# Altium schematic symbol library Electronic Devices_LIB.SchLib: 703 symbols (part 6 of 8) (continued)
## LED_DIO_RED_2mA_0603_LTST-C193KRKT-2A
designator D?, comment Case/Package: 0603  Test Current: 2mA  (hidden comment: LTST-C193KRKT-2A)
Led Red Clear 0603 Smd; Manufacturer: Vishay Lite-On; Lens Color: Colorless; Viewing Angle: 130°; Forward Voltage: 1.9V; Lens Style: Flat; Luminous Intensity: 6.5mcd; Dominant Wavelength: 629nm; Lens Size: 0.8mm; Supplier 1: Digikey; Manufacturer Part Number: LTST-C193KRKT-2A; RoHS: Yes; Category: LEDs; Stock 1: 77790; Pricing 1: 1=0.29, 10=0.16, 100=0.0978, 500=0.07338, 1000=0.06593, 2000=0.05983, 5000=0.05343, 10000=0.04959, 15000=0.04768, 25000=0.04556, 35000=0.04433, 50000=0.04314, 125000=0.0406, 250000=0.03907 (USD); Mount: Surface Mount; Color: Red; Case Code (Metric): 1608; Case Code (Imperial): 0603; Packaging: Cut Tape; Series: -; Lens Transparency: Clear; Length: 1.6mm; Width: 0.8mm; Height: 0.35mm; RoHS Compliant: Yes; ComponentLink1URL: https://datasheet.ciiva.com/6348/ltst-c193krkt-2a-6348473.pdf?src-supplier=Digikey; ComponentLink1Description: https://datasheet.ciiva.com/6348/ltst-c193krkt-2a-6348473.pdf?src-supplier=Digikey; ComponentLink2URL: https://datasheet.ciiva.com/6348/ltst-c193krkt-2a-6348475.pdf?src-supplier=Digikey; ComponentLink2Description: https://datasheet.ciiva.com/6348/ltst-c193krkt-2a-6348475.pdf?src-supplier=Digikey; ComponentLink3URL: https://datasheet.ciiva.com/6348/ltst-c193krkt-2a-6348477.pdf?src-supplier=Digikey; ComponentLink3Description: https://datasheet.ciiva.com/6348/ltst-c193krkt-2a-6348477.pdf?src-supplier=Digikey; Supplier Part Number 1: 160-1909-1-ND
footprint LED_0603-RED-0.75mm (LED 0603 RED height = 0.75mm)
pins: 1 C, 2 A

## LED_DIO_RED_20mA_0603
designator D?, comment Test Current: 20mA  Case/Package: 0603  (hidden comment: LTST-C190KRKT)
LED,  LTST-C190KRKT; Manufacturer: Vishay Lite-On; Color: Red; Lens Color: Colorless; Luminous Intensity: 54mcd; Viewing Angle: 130°; Lens Style: Diffused,Colorless,Clear,Rectangular; Power Rating: 75mW; Dominant Wavelength: 631nm; Lens Transparency: Clear; Number of Elements: 1; Wavelength: 639nm; Reverse Voltage: 5V; Forward Current: 30mA; Forward Voltage: 2.4V; Manufacturer Part Number: LTST-C190KRKT; RoHS: Yes; Category: LEDs; Stock 1: 712361; Pricing 1: 1=0.24000, 10=0.13200, 100=0.06110, 500=0.05640, 1000=0.04418, 2000=0.04324 (USD); Mount: Surface Mount; Number of Pins: 2; Case Code (Metric): 1608; Case Code (Imperial): 0603; Min Operating Temperature: -55°C; Max Operating Temperature: 85°C; Packaging: Tape and Reel; Package Quantity: 1; Illumination Color: Red; Power Dissipation: 75mW; Number of LEDs: 1; Length: 1.6mm; Width: 0.8mm; Height: 0.8mm; Depth: 0.8mm; Radiation Hardening: No; Lead Free: Lead Free; RoHS Compliant: Yes; ComponentLink1URL: https://datasheet.ciiva.com/19482/1260381-19482354.pdf?src-supplier=Jameco; ComponentLink1Description: https://datasheet.ciiva.com/19482/1260381-19482354.pdf?src-supplier=Jameco; ComponentLink2URL: https://datasheet.ciiva.com/12403/100-ltst-c190krkt-59805-12403895.pdf?src-supplier=Mouser; ComponentLink2Description: https://datasheet.ciiva.com/12403/100-ltst-c190krkt-59805-12403895.pdf?src-supplier=Mouser; ComponentLink3URL: https://datasheet.ciiva.com/16427/ltst-c190krkt-16427674.pdf?src-supplier=Future+Electronics; ComponentLink3Description: https://datasheet.ciiva.com/16427/ltst-c190krkt-16427674.pdf?src-supplier=Future+Electronics; ComponentLink4URL: https://datasheet.ciiva.com/15117/getdatasheetpartid-57395-15117240.pdf?src-supplier=Verical; ComponentLink4Description: https://datasheet.ciiva.com/15117/getdatasheetpartid-57395-15117240.pdf?src-supplier=Verical; ComponentLink5URL: https://datasheet.ciiva.com/11774/0900766b80dc02a9-11774043.pdf?src-supplier=Rs; ComponentLink5Description: https://datasheet.ciiva.com/11774/0900766b80dc02a9-11774043.pdf?src-supplier=Rs; ComponentLink6URL: https://datasheet.ciiva.com/2109/s-110-ltst-c190krkt-2109992.pdf?src-supplier=Digi-Key; ComponentLink6Description: https://datasheet.ciiva.com/2109/s-110-ltst-c190krkt-2109992.pdf?src-supplier=Digi-Key; ComponentLink7URL: https://datasheet.ciiva.com/2109/s-110-ltst-c190krkt-2109991.pdf?src-supplier=Digi-Key; ComponentLink7Description: https://datasheet.ciiva.com/2109/s-110-ltst-c190krkt-2109991.pdf?src-supplier=Digi-Key; ComponentLink8URL: https://datasheet.ciiva.com/2109/s-110-ltst-c190krkt-2109993.pdf?src-supplier=Digi-Key; ComponentLink8Description: https://datasheet.ciiva.com/2109/s-110-ltst-c190krkt-2109993.pdf?src-supplier=Digi-Key; ComponentLink9URL: https://datasheet.ciiva.com/26937/getdatasheetpartid-631582-26937958.pdf?src-supplier=Verical; ComponentLink9Description: https://datasheet.ciiva.com/26937/getdatasheetpartid-631582-26937958.pdf?src-supplier=Verical; Supplier 1: Digi-Key; Supplier 2: Mouser; Supplier 3: Arrow Electronics; Supplier Part Number 1: 160-1436-6-ND; Supplier Part Number 2: 859-LTST-C190KRKT; Supplier Part Number 3: LTST-C190KRKT
footprint LED_0603-RED-0.75mm (LED 0603 RED height = 0.75mm)
pins: 1 C, 2 A

## LED_DIO_RGB_1655
designator D?, comment 1655
NeoPixel 5050 RGB LED with Integrated Driver Chip - 10 Pack | Adafruit Industries 1655; Color: Blue,Green,Red; Number of LEDs: 10; Supplier 1: Digi-Key; Manufacturer: Adafruit Industries; Manufacturer Part Number: 1655; RoHS: Yes; Category: LEDs; Stock 1: 1874; Pricing 1: 1=4.5 (USD); Mount: Surface Mount; Length: 5mm; Width: 5mm; ComponentLink1URL: http://www.mouser.com/ds/2/737/SK6812_LED_datasheet_-953546.pdf?src-supplier=Mouser; ComponentLink1Description: http://www.mouser.com/ds/2/737/SK6812_LED_datasheet_-953546.pdf?src-supplier=Mouser; ComponentLink2URL: https://cdn-shop.adafruit.com/product-files/1138/SK6812+LED+datasheet+.pdf?src-supplier=Digi-Key; ComponentLink2Description: https://cdn-shop.adafruit.com/product-files/1138/SK6812+LED+datasheet+.pdf?src-supplier=Digi-Key; Supplier Part Number 1: 1528-1104-ND
footprint LED_RGB_WS2812B_SNAPEDA (5050)
pins: 1 C, 1 C, 1 C, 1-VDD VDD (power), 2 A, 2 A, 2 A, 2-DOUT DO, 3-GND GND (power), 4-DIN DI

## LED_DIO_RGB_3528_150141M173100
designator D?, comment 150141M173100
LED Tri-Color Blue/Green/Red 465nm/515nm/635nm 4-Pin Chip 1411(3528Metric) T/R; Manufacturer: Wurth Electronics; Color: Blue,Green,Red; Lens Color: Colorless; Viewing Angle: 120°; Lens Style: Clear,Round,Flat; Wavelength: 470nm; Forward Current: 30mA; Luminous Intensity: 230mcd; Test Current: 20mA; Forward Voltage: 3.2V; Lens Transparency: Clear; Lens Size: 2.4mm; Supplier 1: Digi-Key; Manufacturer Part Number: 150141M173100; RoHS: Yes; Category: LEDs; Stock 1: 18313; Pricing 1: 1=0.5, 50=0.489, 100=0.426, 500=0.355 (USD); Mount: Surface Mount; Case/Package: 3528; Number of Pins: 4; Case Code (Metric): 3528; Case Code (Imperial): 1411; Min Operating Temperature: -40°C; Max Operating Temperature: 85°C; Package Quantity: 1; Packaging: Cut Tape; Dominant Wavelength: 470nm; Series: WL-SFTW; Length: 3.5mm; Width: 2.8mm; Height: 2.1mm; RoHS Compliant: Yes; Reach SVHC Compliant: Unknown; ComponentLink1URL: https://datasheet.ciiva.com/29562/150141m173100-29562961.pdf?src-supplier=Digi-Key; ComponentLink1Description: https://datasheet.ciiva.com/29562/150141m173100-29562961.pdf?src-supplier=Digi-Key; ComponentLink2URL: https://datasheet.ciiva.com/29278/759471-da-01-en-smd-topled-rgb-150141m173100-29278963.pdf?src-supplier=Conrad; ComponentLink2Description: https://datasheet.ciiva.com/29278/759471-da-01-en-smd-topled-rgb-150141m173100-29278963.pdf?src-supplier=Conrad; ComponentLink3URL: https://datasheet.ciiva.com/22653/1911491-22653029.pdf?src-supplier=Element14; ComponentLink3Description: https://datasheet.ciiva.com/22653/1911491-22653029.pdf?src-supplier=Element14; Supplier Part Number 1: 732-4998-6-ND
footprint LED_RGB_3528 (SMT Full-color TOP LED Waterclear, body 3.5x2.8mm)
pins: 1 A, 2 K, 3 K, 4 K

## LED_DIO_RGB_3528_YG3528RGB3UDB06
designator D?, comment YG3528RGB3UDB06
LED Tri-Color Blue/Green/Red 465nm/515nm/635nm 4-Pin Chip 1411(3528Metric) T/R; Manufacturer: letop; Manufacturer Part Number: 150141M173100; Color: Blue,Green,Red; Lens Color: Colorless; Viewing Angle: 120°; Lens Style: Clear,Round,Flat; Wavelength: 470nm; Forward Current: 30mA; Luminous Intensity: 230mcd; Test Current: 20mA; Forward Voltage: 3.2V; Lens Transparency: Clear; Lens Size: 2.4mm; Supplier 1: Standard Chinese; RoHS: Yes; Category: LEDs; Stock 1: 18313; Pricing 1: 1=0.5, 50=0.489, 100=0.426, 500=0.355 (USD); Mount: Surface Mount; Case/Package: 3528; Number of Pins: 4; Case Code (Metric): 3528; Case Code (Imperial): 1411; Min Operating Temperature: -40°C; Max Operating Temperature: 85°C; Package Quantity: 1; Packaging: Cut Tape; Dominant Wavelength: 470nm; Series: WL-SFTW; Length: 3.5mm; Width: 2.8mm; Height: 2.1mm; RoHS Compliant: Yes; Reach SVHC Compliant: Unknown; Supplier Part Number 1: 732-4998-6-ND; ComponentLink1Description: file:///C:/Users/Elio%20Fagundez/Documents/Upwork%202023/Project%20%2316%20(%20ADN00200%20-%20HUMBERTO%20MATIAS)/Documentation/SMD-3528RGB-ROHS%20%E5%9B%9B%E8%84%9A%E5%85%B1%E9%98%B3(1)(1)%20(1).pdf; ComponentLink1URL: file:///C:/Users/Elio%20Fagundez/Documents/Upwork%202023/Project%20%2316%20(%20ADN00200%20-%20HUMBERTO%20MATIAS)/Documentation/SMD-3528RGB-ROHS%20%E5%9B%9B%E8%84%9A%E5%85%B1%E9%98%B3(1)(1)%20(1).pdf
footprint LED_RGB_3528_YG3528RGB3UDB06 (SMT Full-color TOP LED Waterclear, body 3.5x2.8mm)
pins: 1 K, 2 A, 3 K, 4 K

## LED_DIO_RGB_WS2812B-B/W
designator D?, comment WS2812B-B/W
RGB SMD5050 Light Emitting Diodes (LED) ROHS - LCSC; Manufacturer: Worldsemi; Manufacturer Part Number: 5050; Color: Blue,Green,Red; Number of LEDs: 10; Supplier 1: LCSC; RoHS: Yes; Category: LEDs; Stock 1: 1874; Mount: Surface Mount; Length: 5mm; Width: 5mm; Supplier Part Number 1: 1528-1104-ND; ComponentLink1Description: https://www.lcsc.com/product-detail/Light-Emitting-Diodes-LED_Worldsemi-WS2812B-B-W_C114586.html; ComponentLink1URL: https://www.lcsc.com/product-detail/Light-Emitting-Diodes-LED_Worldsemi-WS2812B-B-W_C114586.html; Pricing 1: 1=0.09(USD)
footprint LED_RGB_WS2812B_SNAPEDA (5050)
pins: 1 VDD (power), 1 C, 1 C, 1 C, 2 DO, 2 A, 2 A, 2 A, 3 GND (power), 4 DI

## LED_DIO_RGB_XL-3528RGBW-WS2812B
designator D?, comment WS2812B-B/W
-25℃~+80℃ Positive post RGB 120° SMD3528-4P Light Emitting Diodes (LED) ROHS; Manufacturer: XINGLIGHT; Manufacturer Part Number: 3528; Color: Blue,Green,Red; Number of LEDs: 10; Supplier 1: LCSC; RoHS: Yes; Category: LEDs; Stock 1: 1874; Mount: Surface Mount; Length: 5mm; Width: 5mm; Supplier Part Number 1: 1528-1104-ND; ComponentLink1Description: https://www.lcsc.com/product-detail/Light-Emitting-Diodes-LED_XINGLIGHT-XL-3528RGBW-WS2812B_C2890364.html; ComponentLink1URL: https://www.lcsc.com/product-detail/Light-Emitting-Diodes-LED_XINGLIGHT-XL-3528RGBW-WS2812B_C2890364.html; Pricing 1: 1=0.09(USD)
footprint LED_RGB_3528_ XL-3528RGBW-WS2812B (SMT Full-color TOP LED Waterclear, body 3.5x2.8mm)
pins: 1 GND (power), 2 DI, 3 VDD (power), 4 DO

## LED_DIO_WHITE_5mA_0201
designator D?, comment Case/Packcage: 0201  Current Rating: 5mA  (hidden comment: IN-S21AT5UW)
Top View / 0201 / 0.65 X 0.38 X; Manufacturer: Inolux; Supplier 1: Digi-Key; Manufacturer Part Number: IN-S21AT5UW; RoHS: No; Category: LEDs; Stock 1: 12000; Pricing 1: 1=0.28, 10=0.222, 100=0.0999, 500=0.09028, 1000=0.07415, 2000=0.06448 (USD); Supplier Part Number 1: 1830-IN-S21AT5UWCT-ND
footprint LED_0201-WHITE-0.41mm (2-SMD, No Lead, 0.65mm L x 0.38mm W)
pins: 1 C, 2 A

## LED_DIO_WHITE_5mA_0603
designator D?, comment Case Code (Imperial): 0603  Test Current: 5mA  (hidden comment: EAST16084WB0)
LED Uni-Color Pure White 2-Pin Chip 0603(1608Metric) T/R; Manufacturer: Everlight; Lens Color: Yellow; Lens Style: Flat; Lens Transparency: Diffused; Viewing Angle: 130°; Lens Size: 0.8mm; Forward Voltage: 2.8V; Manufacturer Part Number: EAST16084WB0; RoHS: Yes; Category: LEDs; Stock 1: 13948; Pricing 1: 1=0.37000, 10=0.24100, 100=0.16080, 500=0.11124, 1000=0.09270 (USD); Mount: Surface Mount; Case/Package: 0603; Case Code (Metric): 1608; Packaging: Cut Tape; Length: 1.6mm; Width: 0.8mm; Height: 0.5mm; RoHS Compliant: No; ComponentLink1URL: https://everlightamericas.com/index.php?controller=attachment&amp;id_attachment=2761&src-supplier=Digi-Key; ComponentLink1Description: https://everlightamericas.com/index.php?controller=attachment&amp;id_attachment=2761&src-supplier=Digi-Key; Supplier 1: Digi-Key; Supplier 2: Arrow Electronics; Supplier 3: Verical; Supplier Part Number 1: 1080-1560-6-ND; Supplier Part Number 2: EAST16084WB0; Supplier Part Number 3: EAST16084WB0; Color: White
footprint LED_0603-WHITE-0.50mm (LED 0603 WHITE height = 0.50mm)
pins: 1 C, 2 A

## LED_DIO_WHITE_20mA_0603_ASCKCW01-NW3X3F1H302
designator D?, comment ASCKCW01-NW3X3F1H302  Case/Packcage: 0603  Test Current: 20mA
1608 Hb White Rohs Compliant: Yes; Manufacturer: Broadcom; Supplier 1: Digikey; Manufacturer Part Number: ASCKCW01-NW3X3F1H302; RoHS: No; Category: LEDs; Stock 1: 59890; Pricing 1: 1=0.46, 10=0.283, 100=0.1626, 1000=0.12726, 2000=0.11666 (USD); Supplier Part Number 1: 516-ASCKCW01-NW3X3F1H302CT-ND
footprint LED_0603-WHITE-0.50mm (LED 0603 WHITE height = 0.50mm)
pins: 1 C, 2 A

## LED_DIO_WHITE_RA_20mA_IN-S121ASUW
designator D?, comment IN-S121ASUW  (value not drawn)
Led White Clear 1208 SMD R/a; Manufacturer: Inolux; Lens Style: Domed; Luminous Intensity: 900mcd; Forward Voltage: 3.2V; Test Current: 20mA; Viewing Angle: 120°; Lens Size: 1mm; Supplier 1: Digikey; Manufacturer Part Number: IN-S121ASUW; RoHS: No; Category: LEDs; Stock 1: 98886; Pricing 1: 1=0.42, 10=0.259, 100=0.1487, 1000=0.11635, 3000=0.10666, 6000=0.09696, 15000=0.0905, 30000=0.08726, 75000=0.08403 (USD); Mount: Surface Mount; Case/Package: SMD/SMT; Color: White; Lens Color: Clear; Packaging: Cut Tape; Lens Transparency: Clear; Series: IN-S121AS; Length: 3mm; Width: 2.1mm; Height: 1mm; ComponentLink1URL: http://www.inolux-corp.com/datasheet/SMDLED/Mono%20Color%20Side%20View/IN-S121AS%20Series_V1.1.pdf?src-supplier=Digikey; ComponentLink1Description: http://www.inolux-corp.com/datasheet/SMDLED/Mono%20Color%20Side%20View/IN-S121AS%20Series_V1.1.pdf?src-supplier=Digikey; Supplier Part Number 1: 1830-1038-1-ND

## MECH_BATTERY_HOLDER_BH600
designator BH?, comment BH600
Battery Holder 1 Cells Thermoplastic Tray; Manufacturer: Memory Protection Devices; Number of Cells: 1; Supplier 1: Digikey; Manufacturer Part Number: BH600; RoHS: Yes; Category: Batteries and Accessories; Stock 1: 122929; Pricing 1: 1=1.7, 10=1.408, 50=1.236, 100=1.1686, 300=1.06927, 500=1.02602, 1000=0.97012, 2500=0.90087, 5000=0.85178 (USD); Mount: Through Hole,PCB; Min Operating Temperature: -55°C; Max Operating Temperature: 180°C; Series: -; Termination: PC Pin; Diameter: 16mm; Height: 3.2mm; Lead Free: Lead Free; RoHS Compliant: Yes; ComponentLink1URL: https://datasheet.ciiva.com/3/bh600-datasheet-3856.pdf?src-supplier=Digikey; ComponentLink1Description: https://datasheet.ciiva.com/3/bh600-datasheet-3856.pdf?src-supplier=Digikey; Supplier Part Number 1: BH600-ND
footprint MECH_BATTERY_HOLDER_BH600
pins: 1 -, 2 +

## MECH_M12_LENS_MOUNT
designator MECH?, comment M12 Lens Mount
M12 Lens Mount, 20mm Spacing and 10mm Height, PC; Manufacturer: commonlands; Manufacturer part number: CLA020; ComponentLink1Description: Supplier; ComponentLink1URL: https://commonlands.com/products/m12-lens-mount-20mm-spacing
footprint M12 LENS MOUNT (Pitch 20mm)

## MECH_MICROSD_HOLDER_MSD-4-A
designator MICRO_SD?, comment MSD-4-A
Micro Sd Card Connector, 9 Posit; Manufacturer: CUI Devices; Supplier 1: Digikey; Manufacturer Part Number: MSD-4-A; RoHS: No; Stock 1: 10779; Pricing 1: 1=0.35, 10=0.348, 25=0.3408, 50=0.3204, 100=0.2727, 250=0.25224, 500=0.24544, 1000=0.2318, 5000=0.22498, 10000=0.21816 (USD); Supplier Part Number 1: 2223-MSD-4-ACT-ND
footprint MICROSD_MSD4A
pins: 1 DAT2, 2 CD/DAT3, 3 CMD, 4 VDD, 5 CLK, 6 VSS, 7 DAT0, 8 DAT1, CD1, G1 GND_1, G2 GND_2, G3 GND_3, G4 GND_4

## MECH_Screw_M3_4mm_Pan_Phil_NPT
designator MH?, comment 92005A112
Mechanical Screw, M3, 4mm, Pan Head, Philips, Non-Plated Hole; Thread Pitch: 0.5 mm; Threading: Fully Threaded; Head Diameter: 6.00 mm; Head Height: 2.40 mm; Drive Style: Phillips; Manufacturer Part Number: 92005A112; Supplier Part Number: 92005A112; Supplier: McMaster-Carr; Thread Size: M3; Length: 4 mm; ComponentLink1Description: Product Page; ComponentLink1URL: https://www.mcmaster.com/#92005a112/=1earvkb
footprint MECH_SCREW_M3_4MM_PAN_PHIL_NPT (Mechanical Screw, M3, 4mm, Pan Head, Philips, Non-Plated Hole)

## MECH_SPRING_KEY_TOUCH_1PIN
designator P?, comment NOT COMPONENT
Finewe Factory Custom Battery pcb Mount Spring Compression Contact Springs For Touch Keyboard; ComponentLink1Description: Supplier; ComponentLink1URL: https://www.alibaba.com/product-detail/Finewe-Factory-Custom-Battery-Pcb-Mount_1600184085501.html?spm=a2700.7724857.0.0.3cd3f949MPf5wX&s=p
footprint MECH_SENSOR_CAP_TOUCH_1PIN (DIA = 6mm ,HEIGHT= 9mm HOLE U = 0.9mm HOLE S = 0.4mm)
pins: 1, 2

## MECH_SPRING_KEY_TOUCH_BUTTON
designator S?, comment NOT COMPONENT
Finewe Factory Custom Battery pcb Mount Spring Compression Contact Springs For Touch Keyboard; ComponentLink1Description: Supplier; ComponentLink1URL: https://www.alibaba.com/product-detail/Finewe-Factory-Custom-Battery-Pcb-Mount_1600184085501.html?spm=a2700.7724857.0.0.3cd3f949MPf5wX&s=p
footprint MECH_SENSOR_CAP_TOUCH (DIA = 6mm ,HEIGHT= 9mm HOLE U = 0.9mm HOLE S = 0.4mm)
pins: 1, 2

## MECHANICALS_MOUNT_PTH
designator H?, comment Mounting Hole  (value not drawn)  (no BOM)
Mounting Hole, Plated
footprint PTH_2.7X6 (PTH 2.7mm drill 6mm ring)
footprint PTH_1.5X3 (PTH 1.5mm drill 3mm ring)
footprint PTH_2.1X4 (PTH 2.1mm drill 4mm ring)
footprint PTH_3.2X5 (PTH 3.2mm drill 5mm ring)
footprint PTH_1.3X2.5 (PTH 3mm drill 2.5mm ring)
pins: 1

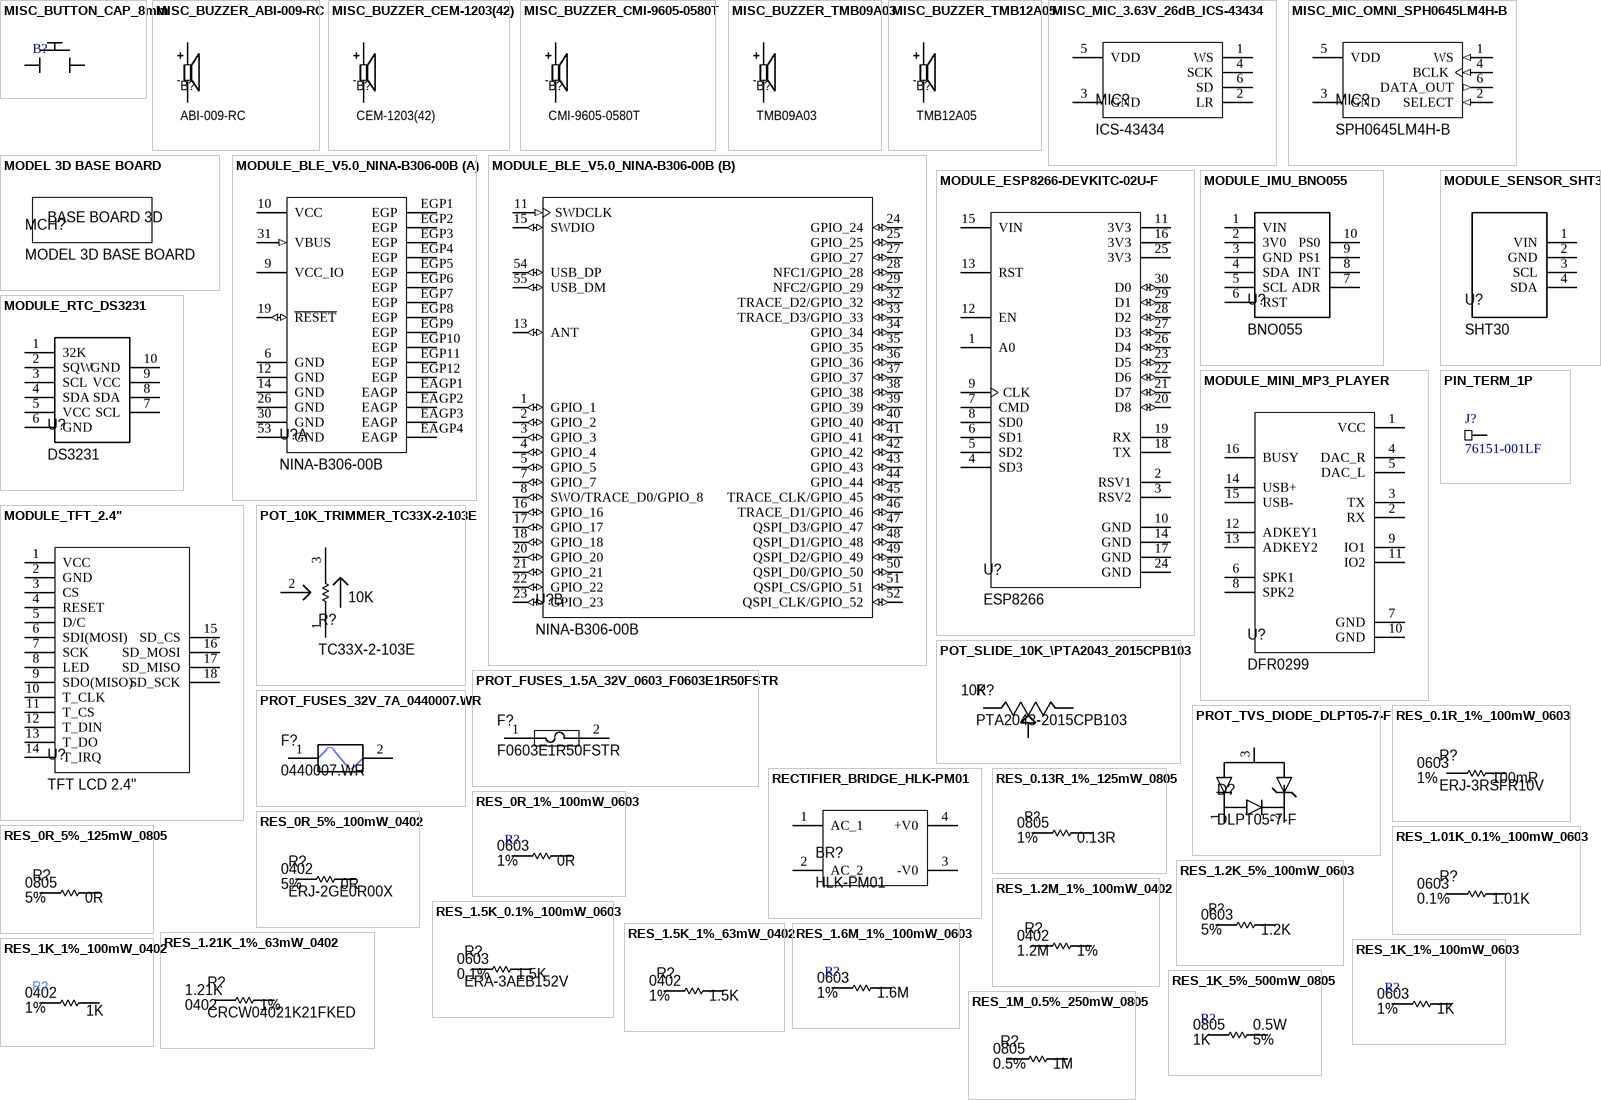
[diagram p31: symbols MISC_BUTTON_CAP_8mm to RES_1M_0.5%_250mW_0805]

## MISC_BUTTON_CAP_8mm
designator B?, comment BUTTON_CAP_8mm  (value not drawn)
Buttom custom to capacitive sensors
footprint MECH_SENSOR_CAP_TOUCH (DIA = 6mm ,HEIGHT= 9mm HOLE U = 0.9mm HOLE S = 0.4mm)
pins: 1, 2

## MISC_BUZZER_ABI-009-RC
designator B?, comment ABI-009-RC
Audio Indicator Buzzer Electromagnetic 8V 30mA Pin Through Hole; Manufacturer: Multicomp; Supplier 1: Newark; Manufacturer Part Number: ABI-009-RC; RoHS: No; Stock 1: 24406; Pricing 1: 1=4.08, 10=3.63, 100=2.83, 500=2.29, 1000=1.97, 5000=1.75, 10000=1.56, 25000=1.5 (USD); Supplier Part Number 1: 96K6086
footprint MISC_BUZZER_ABI-009-RC (0.472" Dia (12.00mm))
pins: N, P

## MISC_BUZZER_CEM-1203(42)
designator B?, comment CEM-1203(42)
12 mm, 3.5 V, 85 dB, Through Hole, Magnetic Audio Transducer Buzzer; Manufacturer: CUI; Frequency: 2.048kHz; Self Resonant Frequency: 2.05kHz; Voltage Rating: 3.5V; Operating Supply Current: 35mA; Washable: No; Supplier 1: Digi-Key; Manufacturer Part Number: CEM-1203(42); RoHS: Yes; Category: Uncategorized; Mount: Through Hole; Min Operating Temperature: -20°C; Max Operating Temperature: 60°C; Packaging: Bulk; Termination: PC Pins; Series: CEM; Sensing Method: Magnetic; Diameter: 12mm; Height: 9mm; Lead Free: Lead Free; ComponentLink1URL: https://datasheet.ciiva.com/0/cem-1203-42-135.pdf?src-supplier=Digi-Key; ComponentLink1Description: https://datasheet.ciiva.com/0/cem-1203-42-135.pdf?src-supplier=Digi-Key; Supplier Part Number 1: 102-1153-ND
footprint MISC_BUZZER_CUI_CEM-1203(42) (0.472" Dia (12.00mm))
pins: N, P

## MISC_BUZZER_CMI-9605-0580T
designator B?, comment CMI-9605-0580T
Audio Signaling/Alarm Devices; Manufacturer: CUI Devices; Supplier 1: Digi-Key; Manufacturer Part Number: CMI-9605-0580T; RoHS: Yes; Category: Buzzers; Stock 1: 1341; Pricing 1: 1=1.35, 10=1.121, 25=1.0376, 50=0.9768, 100=0.9179, 500=0.78974, 1000=0.73827, 5000=0.72346 (USD); Supplier Part Number 1: 102-CMI-9605-0580T-ND
footprint MISC_BUZZER_CMI96050580T (0.378" Dia (9.60mm))
pins: N, P

## MISC_BUZZER_TMB09A03
designator B?, comment TMB09A03
Audio Signaling/Alarm Devices - 3.3V; Manufacturer: Chinese standard; Manufacturer Part Number: TMB09A03; RoHS: Yes; Category: Buzzers; Stock 1: 1341; Pricing 1: 1=1.35, 10=1.121, 25=1.0376, 50=0.9768, 100=0.9179, 500=0.78974, 1000=0.73827, 5000=0.72346 (USD)
footprint MISC_BUZZER_CMI96050580T (0.378" Dia (9.60mm))
pins: N, P

## MISC_BUZZER_TMB12A05
designator B?, comment TMB12A05
Active (driven circuit included) 85dB@5V,10cm Magnetic 5V 2300Hz Plugin,D=12mm Buzzers ROHS; Manufacturer: Jiangsu Huaneng Elec; Frequency: 2.048kHz; Self Resonant Frequency: 2.05kHz; Voltage Rating: 3V-8V; Operating Supply Current: 35mA; Washable: No; Manufacturer Part Number: TMB12A05; RoHS: Yes; Category: Uncategorized; Mount: Through Hole; Min Operating Temperature: -20°C; Max Operating Temperature: 60°C; Packaging: Bulk; Termination: PC Pins; Series: CEM; Sensing Method: Magnetic; Diameter: 12mm; Height: 9.8mm; Lead Free: Lead Free; Supplier Part Number 1: 102-1153-ND; ComponentLink1Description: https://www.lcsc.com/product-detail/span-style-background-color-ff0-Buzzers-span_Jiangsu-Huaneng-Elec-TMB12A05_C96093.html; ComponentLink1URL: *; Supplier 1: LCSC
footprint MISC_BUZZER_TMB12A05 (0.472" Dia (12.00mm))
pins: N, P

## MISC_MIC_3.63V_26dB_ICS-43434
designator MIC?, comment ICS-43434
Mic Omni-Directional -26dB 3.63V Rectangular Solder Pad T/R; Manufacturer: TDK InvenSense; Direction: Omnidirectional; Operating Supply Current: 550uA; Supplier 1: Digi-Key; Manufacturer Part Number: ICS-43434; RoHS: No; Category: Microphones; Stock 1: 522924; Pricing 1: 1=3.13, 10=2.585, 25=2.3848, 50=2.2398, 100=2.1003, 250=1.95132, 500=1.81194 (USD); Shape: Rectangular; Packaging: Cut Tape; Termination: Solder; Series: ICS-43434; RoHS Compliant: No; ComponentLink1URL: http://www.farnell.com/datasheets/2632666.pdf?src-supplier=Farnell; ComponentLink1Description: http://www.farnell.com/datasheets/2632666.pdf?src-supplier=Farnell; ComponentLink2URL: https://www.invensense.com/wp-content/uploads/2016/02/DS-000069-ICS-43434-v1.2.pdf?ref_disty=digikey&src-supplier=Digi-Key; ComponentLink2Description: https://www.invensense.com/wp-content/uploads/2016/02/DS-000069-ICS-43434-v1.2.pdf?ref_disty=digikey&src-supplier=Digi-Key; ComponentLink3URL: https://www.invensense.com/wp-content/uploads/2016/02/PB-000018-ICS-43434-v1.1.pdf?src-supplier=Digi-Key; ComponentLink3Description: https://www.invensense.com/wp-content/uploads/2016/02/PB-000018-ICS-43434-v1.1.pdf?src-supplier=Digi-Key; ComponentLink4URL: http://www.farnell.com/datasheets/2632666.pdf?src-supplier=Newark; ComponentLink4Description: http://www.farnell.com/datasheets/2632666.pdf?src-supplier=Newark; ComponentLink5URL: http://www.farnell.com/datasheets/2632666.pdf?src-supplier=Element14; ComponentLink5Description: http://www.farnell.com/datasheets/2632666.pdf?src-supplier=Element14; Supplier Part Number 1: 1428-1066-6-ND
footprint MISC_MIC_TDK_InvenSense_0_MFG (0.138" L x 0.104" W (3.50mm x 2.65mm))
pins: 1 WS, 2 LR, 3 GND, 4 SCK, 5 VDD, 6 SD

## MISC_MIC_OMNI_SPH0645LM4H-B
designator MIC?, comment SPH0645LM4H-B
Crawford Mic Dgt I2S Bottom Port; Manufacturer: Knowles; Shape: Rectangular; Max Supply Voltage: 3.6V; Min Supply Voltage: 1.62V; Direction: Omnidirectional; Voltage Rating: 1.8V; Operating Supply Current: 600uA; Capacitance: 120pF; Frequency: 3.072MHz; Supplier 1: Digikey; Manufacturer Part Number: SPH0645LM4H-B; RoHS: Yes; Category: Microphones; Stock 1: 247455; Pricing 1: 1=1.95, 10=1.586, 25=1.4876, 5900=1.4875 (USD); Min Operating Temperature: -40°C; Max Operating Temperature: 45°C; Series: SiSonic™ SPH; Packaging: Cut Tape; Termination: Solder; Current: 600uA; Operating Supply Voltage: 1.8V; RoHS Compliant: Yes; ComponentLink1URL: https://media.digikey.com/pdf/Data%20Sheets/Knowles%20Acoustics%20PDFs/SPH0645LM4H-B.pdf?src-supplier=Digikey; ComponentLink1Description: https://media.digikey.com/pdf/Data%20Sheets/Knowles%20Acoustics%20PDFs/SPH0645LM4H-B.pdf?src-supplier=Digikey; Supplier Part Number 1: 423-SPH0645LM4H-BCT-ND
footprint MISC_MIC_SPH0645LM4H-B
pins: 1 WS (in), 2 SELECT (in), 3 GND (power), 4 BCLK (in), 5 VDD (power), 6 DATA_OUT (out)

## MODEL 3D BASE BOARD
designator MCH?
footprint BASE BOARD 3D (MODEL 3D BASE BOARD)

## MODULE_BLE_V5.0_NINA-B306-00B
designator U?, comment NINA-B306-00B
NINA-B30 Series 3.6 V -100 dBm Stand-Alone Bluetooth 5 Low Energy Module; Manufacturer: u-blox; Supplier 1: Digikey; Manufacturer Part Number: NINA-B306-00B; RoHS: Yes; Category: RF Receivers, Transceivers; Stock 1: 9392; Pricing 1: 1=14.35, 10=12.92, 50=11.62, 100=11.1321 (USD); ComponentLink1URL: https://datasheet.octopart.com/NINA-B306-00B-u-blox-datasheet-165786290.pdf?src-supplier=TME; ComponentLink1Description: https://datasheet.octopart.com/NINA-B306-00B-u-blox-datasheet-165786290.pdf?src-supplier=TME; Supplier Part Number 1: 672-NINA-B306-00BCT-ND
footprint MODULE_BLE_NINA_XCVR_NINA-B306-00B (NINA B306 00B)
part A pins: 6 GND (power), 9 VCC_IO (power), 10 VCC (power), 12 GND (power), 14 GND (power), 19 ~{RESET} (io), 26 GND (power), 30 GND (power), 31 VBUS (in), 53 GND (power), EAGP1 EAGP (power), EAGP2 EAGP (power), EAGP3 EAGP (power), EAGP4 EAGP (power), EGP1 EGP (power), EGP2 EGP (power), EGP3 EGP (power), EGP4 EGP (power), EGP5 EGP (power), EGP6 EGP (power), EGP7 EGP (power), EGP8 EGP (power), EGP9 EGP (power), EGP10 EGP (power), EGP11 EGP (power), EGP12 EGP (power)
part B pins: 1 GPIO_1 (io), 2 GPIO_2 (io), 3 GPIO_3 (io), 4 GPIO_4 (io), 5 GPIO_5 (io), 7 GPIO_7 (io), 8 SWO/TRACE_D0/GPIO_8 (io), 11 SWDCLK (in), 13 ANT (io), 15 SWDIO (io), 16 GPIO_16 (io), 17 GPIO_17 (io), 18 GPIO_18 (io), 20 GPIO_20 (io), 21 GPIO_21 (io), 22 GPIO_22 (io), 23 GPIO_23 (io), 24 GPIO_24 (io), 25 GPIO_25 (io), 27 GPIO_27 (io), 28 NFC1/GPIO_28 (io), 29 NFC2/GPIO_29 (io), 32 TRACE_D2/GPIO_32 (io), 33 TRACE_D3/GPIO_33 (io), 34 GPIO_34 (io), 35 GPIO_35 (io), 36 GPIO_36 (io), 37 GPIO_37 (io), 38 GPIO_38 (io), 39 GPIO_39 (io), 40 GPIO_40 (io), 41 GPIO_41 (io), 42 GPIO_42 (io), 43 GPIO_43 (io), 44 GPIO_44 (io), 45 TRACE_CLK/GPIO_45 (io), 46 TRACE_D1/GPIO_46 (io), 47 QSPI_D3/GPIO_47 (io), 48 QSPI_D1/GPIO_48 (io), 49 QSPI_D2/GPIO_49 (io), 50 QSPI_D0/GPIO_50 (io), 51 QSPI_CS/GPIO_51 (io), 52 QSPI_CLK/GPIO_52 (io), 54 USB_DP (io), 55 USB_DM (io)

## MODULE_ESP8266-DEVKITC-02U-F
designator U?, comment ESP8266
HiLetgo ESP8266 NodeMCU CP2102 ESP-12E; Manufacturer: Espressif Systems; Frequency: 2.4GHz; Supplier 1: Digikey; Manufacturer Part Number: ESP8266; RoHS: No; Category: RF Semiconductors and Devices; Stock 1: 224; Pricing 1: 1=8 (USD); Series: -; ComponentLink1Description: Supplier; ComponentLink1URL: https://www.amazon.com.br/HiLetgo-Desenvolvimento-Internet-Funciona-Micropython/dp/B010O1G1ES?th=1; Supplier Part Number 1: 1965-1002-ND
footprint MODULE_ESP8266
pins: 1 A0, 2 RSV1, 3 RSV2, 4 SD3, 5 SD2, 6 SD1, 7 CMD, 8 SD0, 9 CLK, 10 GND (power), 11 3V3 (power), 12 EN, 13 RST, 14 GND (power), 15 VIN, 16 3V3 (power), 17 GND (power), 18 TX, 19 RX, 20 D8 (io), 21 D7 (io), 22 D6 (io), 23 D5 (io), 24 GND (power), 25 3V3 (power), 26 D4 (io), 27 D3 (io), 28 D2 (io), 29 D1 (io), 30 D0 (io)

## MODULE_IMU_BNO055
designator U?, comment BNO055
Intelligent absolute orientation sensor, 9 axis; Manufacturer Part Number: BNO055; ComponentLink1Description: Supplier Link; ComponentLink1URL: https://learn.adafruit.com/adafruit-bno055-absolute-orientation-sensor
footprint IMU_BNO055
pins: 1 VIN, 2 3V0, 3 GND, 4 SDA, 5 SCL, 6 RST, 7 ADR, 8 INT, 9 PS1, 10 PS0

## MODULE_MINI_MP3_PLAYER
designator U?, comment DFR0299
DFPlayer - A Mini MP3 Player For Arduino; Manufacturer: DFRobot; Supplier 1: Digikey; Manufacturer Part Number: DFR0299; RoHS: No; Stock 1: 823; Pricing 1: 1=5.9 (USD); Series: -; ComponentLink1URL: https://github.com/Arduinolibrary/DFPlayer_Mini_mp3/raw/master/DFPlayer%20Mini%20Manual.pdf?src-supplier=Digikey; ComponentLink1Description: https://github.com/Arduinolibrary/DFPlayer_Mini_mp3/raw/master/DFPlayer%20Mini%20Manual.pdf?src-supplier=Digikey; Supplier Part Number 1: 1738-1041-ND
footprint MODULE_DFR0299
pins: 1 VCC (power), 2 RX, 3 TX, 4 DAC_R, 5 DAC_L, 6 SPK1, 7 GND (power), 8 SPK2, 9 IO1, 10 GND (power), 11 IO2, 12 ADKEY1, 13 ADKEY2, 14 USB+, 15 USB-, 16 BUSY

## MODULE_RTC_DS3231
designator U?, comment DS3231
RTC Module Clock Timer Memory; Manufacturer Part Number: DS3231; ComponentLink1Description: Supplier Link; ComponentLink1URL: https://www.amazon.co.uk/DS3231-AT24C32-Module-Memory-Female/dp/B0BZVRW31V/ref=sr_1_2_sspa?crid=9D2YWJDN2MU2&keywords=Arduino+DS3231&qid=1708342061&sprefix=arduino+ds3231%2Caps%2C185&sr=8-2-spons&sp_csd=d2lkZ2V0TmFtZT1zcF9hdGY&psc=1
footprint RTC_DS3231
pins: 1 32K, 2 SQW, 3 SCL, 4 SDA, 5 VCC, 6 GND, 7 SCL, 8 SDA, 9 VCC, 10 GND

## MODULE_SENSOR_SHT30
designator U?, comment SHT30
SHT30 Temperature And Humidity Sensor; Manufacturer Part Number: SHT30; ComponentLink1Description: Supplier Link; ComponentLink1URL: https://www.adafruit.com/product/5064
footprint SENSOR_SHT30
pins: 1 VIN, 2 GND, 3 SCL, 4 SDA

## MODULE_TFT_2.4"
designator U?, comment TFT LCD 2.4"
Display Lcd 2.4 Pol 240x320 Micro Sd Touch Screen
footprint MODULE_TFT_2.4"
pins: 1 VCC, 2 GND, 3 CS, 4 RESET, 5 D/C, 6 SDI(MOSI), 7 SCK, 8 LED, 9 SDO(MISO), 10 T_CLK, 11 T_CS, 12 T_DIN, 13 T_DO, 14 T_IRQ, 15 SD_CS, 16 SD_MOSI, 17 SD_MISO, 18 SD_SCK

## PIN_TERM_1P
designator J?, comment 76151-001LF
Pin Terminal Phosphor Bronze M 8.76mm Gold Over Nickel Loose; Manufacturer: Amphenol ICC / FCI; Current Rating: 5A; Gender: Male; Voltage Rating: 1kV; Insulation: Non-Insulated; Board Thickness: 0.125inch; Hole Diameter: 0.034inch; Supplier 1: Mouser; Manufacturer Part Number: 76151-001LF; RoHS: Yes; Category: Terminals; Stock 1: 8586; Pricing 1: 1=1.93000, 10=1.69000, 50=1.69000, 100=1.50000, 250=1.36000, 500=1.25000, 1000=1.07000, 2000=1.00000, 5000=0.95000, 10000=0.92900 (USD); Mount: Through Hole; Contact Material: Bronze,Copper Alloy; Contact Plating: Gold; Material: Copper Alloy; Body Plating: Gold; Body Material: Bronze; Min Operating Temperature: -40°C; Max Operating Temperature: 125°C; Package Quantity: 1000; Packaging: Bulk; Contact Gender: Male; Termination: Solder; Series: Bergpin®; Length: 8.76mm; Depth: 0.64mm; Radiation Hardening: No; Lead Free: Lead Free; RoHS Compliant: Yes; ComponentLink1URL: https://datasheet.ciiva.com/9354/76151-9354382.pdf?src-supplier=Avnet; ComponentLink1Description: https://datasheet.ciiva.com/9354/76151-9354382.pdf?src-supplier=Avnet; ComponentLink2URL: https://datasheet.ciiva.com/847/76151-847396.pdf?src-supplier=Digi-Key; ComponentLink2Description: https://datasheet.ciiva.com/847/76151-847396.pdf?src-supplier=Digi-Key; Supplier Part Number 1: 649-76151-001LF
footprint PIN_TERM_Amphenol FCI 76151-001LF (Single Post TermTerminal Connector Through Hole Gold 0.025" (0.64mm) Square)
pins: 1

## POT_10K_TRIMMER_TC33X-2-103E
designator R?, comment TC33X-2-103E  Resistance: 10K
Cermet trimmer potentiometer, 10 kΩ, 0.1 W, SMD, on top, TC33X-2-103E; Manufacturer: Bourns; Tolerance: 25%; Number of Turns: 1; Power Rating: 100mW; Temperature Coefficient: 250ppm/°C; Voltage Rating (DC): 50V; Supplier 1: Digikey; Manufacturer Part Number: TC33X-2-103E; RoHS: Yes; Category: Variable Resistors and Potentiometers; Stock 1: 128239; Pricing 1: 1=0.28, 10=0.273, 25=0.246, 50=0.2348, 100=0.2272, 250=0.21208, 500=0.19316, 1000=0.17422 (USD); Mount: Surface Mount; Color: Silver; Weight: 29.4mg; Min Operating Temperature: -40°C; Max Operating Temperature: 100°C; Packaging: Tape and Reel; Package Quantity: 1; Resistor Type: Cermet; Termination: Foot Print; Taper: Linear; Max Power Dissipation: 100mW; Series: TC33; Resistance Tolerance: 25%; Length: 3mm; Width: 0.118inch; Height: 0.047inch; Depth: 3.8mm; Radiation Hardening: No; Reach SVHC Compliant: No; Military Standard: Not; Lead Free: Lead Free; RoHS Compliant: Yes; ComponentLink1URL: https://datasheet.ciiva.com/11830/0900766b802749b3-11830705.pdf?src-supplier=Rs; ComponentLink1Description: https://datasheet.ciiva.com/11830/0900766b802749b3-11830705.pdf?src-supplier=Rs; ComponentLink2URL: https://datasheet.ciiva.com/7953/1818686-7953349.pdf?src-supplier=Element14; ComponentLink2Description: https://datasheet.ciiva.com/7953/1818686-7953349.pdf?src-supplier=Element14; ComponentLink3URL: https://datasheet.ciiva.com/28659/1520225-28659212.pdf?src-supplier=Element14; ComponentLink3Description: https://datasheet.ciiva.com/28659/1520225-28659212.pdf?src-supplier=Element14; ComponentLink4URL: https://datasheet.ciiva.com/2155/tc33-2155963.pdf?src-supplier=Digikey; ComponentLink4Description: https://datasheet.ciiva.com/2155/tc33-2155963.pdf?src-supplier=Digikey; ComponentLink5URL: https://datasheet.ciiva.com/2155/tc33-2155964.pdf?src-supplier=Digikey; ComponentLink5Description: https://datasheet.ciiva.com/2155/tc33-2155964.pdf?src-supplier=Digikey; ComponentLink6URL: https://datasheet.ciiva.com/2155/tc33-2155962.pdf?src-supplier=Digikey; ComponentLink6Description: https://datasheet.ciiva.com/2155/tc33-2155962.pdf?src-supplier=Digikey; ComponentLink7URL: https://datasheet.ciiva.com/8089/tc33-8089484.pdf?src-supplier=Avnet; ComponentLink7Description: https://datasheet.ciiva.com/8089/tc33-8089484.pdf?src-supplier=Avnet; ComponentLink8URL: https://datasheet.ciiva.com/26944/getdatasheetpartid-183773-26944166.pdf?src-supplier=Verical; ComponentLink8Description: https://datasheet.ciiva.com/26944/getdatasheetpartid-183773-26944166.pdf?src-supplier=Verical; Supplier Part Number 1: TC33X-103ECT-ND
footprint POT_TRIM_TC33X-2-103E
pins: 1 CCW, 2 W, 3 CW

## POT_SLIDE_10K_\PTA2043_2015CPB103
designator R?, comment PTA2043-2015CPB103  Resistance: 10K
PTA Series Low Profile Slide Potentiometer 10K Ohm 20% 0.1 W 1(Elec)/1(Mech)Turn Thru-Hole Tray; Manufacturer: Bourns; Power Rating: 100mW; Supplier 1: Digikey; Manufacturer Part Number: PTA2043-2015CPB103; RoHS: Yes; Category: Variable Resistors and Potentiometers; Stock 1: 3831; Pricing 1: 1=1.78, 10=1.434, 25=1.3144, 40=1.2565, 100=1.1507, 300=1.03497, 500=0.98492, 1000=0.92061, 4900=0.78739 (USD); Mount: Through Hole; Min Operating Temperature: -10°C; Max Operating Temperature: 50°C; Tolerance: 20%; Package Quantity: 100; Packaging: Tray; Termination: Pin; Taper: Linear; Max Power Dissipation: 100mW; Type: Potentiometer; Series: Pro Audio PTA; Technology: CARBON FILM; Resistance Tolerance: 20%; Length: 35mm; Depth: 9mm; Reach SVHC Compliant: No; Military Standard: Not; RoHS Compliant: Yes; ComponentLink1URL: https://datasheet.ciiva.com/6248/pta-6248474.pdf?src-supplier=Digikey; ComponentLink1Description: https://datasheet.ciiva.com/6248/pta-6248474.pdf?src-supplier=Digikey; Supplier Part Number 1: PTA2043-2015CPB103-ND
footprint TRIM_PTA2043-2015CPB103
pins: 1, 2, 3
